# Altium schematic symbol library FPGA_Xilinx_Virtex7.SchLib: 34 symbols (part 20 of 34)
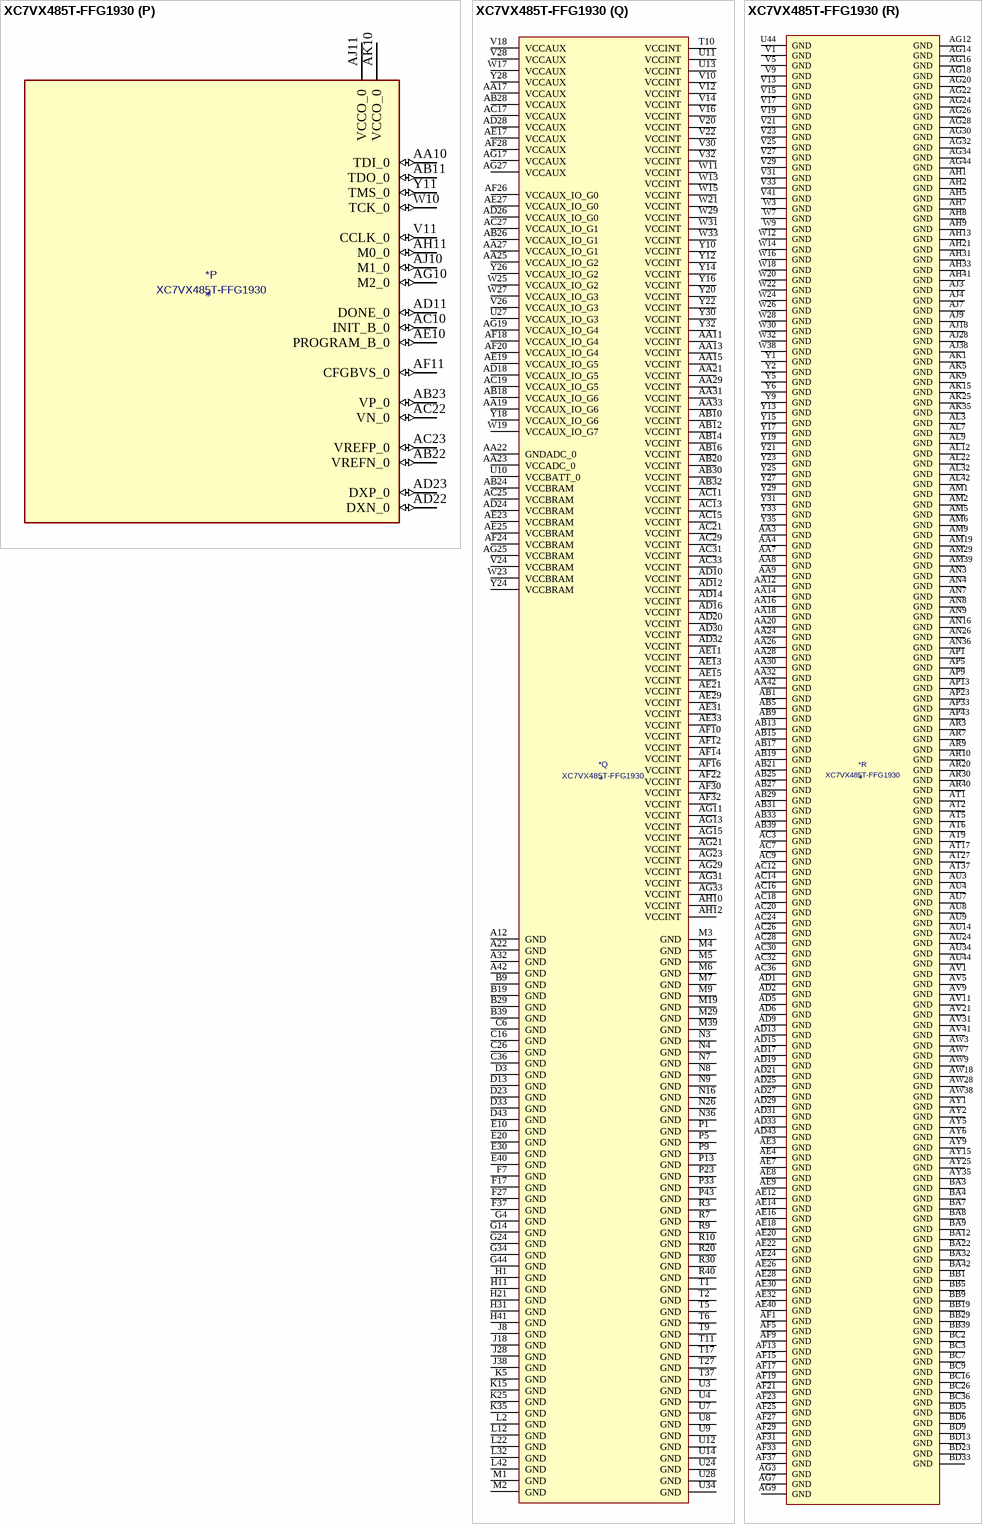
[diagram p191: symbol XC7VX485T-FFG1930]

## XC7VX485T-FFG1930
designator *  value XC7VX485T-FFG1930
ki_keywords: FPGA; ki_description: Virtex 7 XT 485 XC7VX485T-FFG1930
part A pins: AK30 VCCO_10 (power), AN31 VCCO_10 (power), AU29 VCCO_10 (power), AW33 VCCO_10 (power), AW43 VCCO_11 (power), AY30 VCCO_10 (power), AY40 VCCO_11 (power), BA37 VCCO_11 (power), BB34 VCCO_11 (power), BB44 VCCO_11 (power), BC31 VCCO_10 (power), BC41 VCCO_11 (power), BD38 VCCO_11 (power)
part B pins: AH26 VCCO_12 (power), AL27 VCCO_12 (power), AP28 VCCO_12 (power), AP32 IO_L24P_T3_13 (io), AP34 IO_L21P_T3_DQS_13 (io), AP35 IO_0_VRN_13 (io), AP36 IO_L15P_T2_DQS_13 (io), AP38 VCCO_13 (power), AR25 VCCO_12 (power), AR32 IO_L24N_T3_13 (io), AR33 IO_L23P_T3_13 (io), AR34 IO_L21N_T3_DQS_13 (io), AR35 VCCO_13 (power), AR36 IO_L17P_T2_13 (io), AR37 IO_L15N_T2_DQS_13 (io), AR38 IO_L12P_T1_MRCC_13 (io), AR39 IO_L7P_T1_13 (io), AR41 IO_L6P_T0_13 (io), AR42 IO_L5P_T0_13 (io), AR43 IO_L5N_T0_13 (io), AR44 IO_L1P_T0_13 (io), AT32 VCCO_13 (power), AT33 IO_L23N_T3_13 (io), AT34 IO_L19P_T3_13 (io), AT35 IO_L19N_T3_VREF_13 (io), AT36 IO_L17N_T2_13 (io), AT38 IO_L11P_T1_SRCC_13 (io), AT39 IO_L12N_T1_MRCC_13 (io), AT40 IO_L7N_T1_13 (io), AT41 IO_L6N_T0_VREF_13 (io), AT42 VCCO_13 (power), AT43 IO_L3P_T0_DQS_13 (io), AT44 IO_L1N_T0_13 (io), AU32 IO_L20P_T3_13 (io), AU33 IO_L20N_T3_13 (io), AU35 IO_25_VRP_13 (io), AU36 IO_L13P_T2_MRCC_13 (io), AU37 IO_L13N_T2_MRCC_13 (io), AU38 IO_L11N_T1_SRCC_13 (io), AU39 VCCO_13 (power), AU40 IO_L9P_T1_DQS_13 (io), AU41 IO_L9N_T1_DQS_13 (io), AU42 IO_L4P_T0_13 (io), AU43 IO_L3N_T0_DQS_13 (io), AV26 VCCO_12 (power), AV33 IO_L22P_T3_13 (io), AV34 IO_L22N_T3_13 (io), AV35 IO_L16P_T2_13 (io), AV36 VCCO_13 (power), AV37 IO_L14P_T2_SRCC_13 (io), AV38 IO_L14N_T2_SRCC_13 (io), AV39 IO_L10P_T1_13 (io), AV40 IO_L8P_T1_13 (io), AV42 IO_L4N_T0_13 (io), AV43 IO_L2P_T0_13 (io), AV44 IO_L2N_T0_13 (io), AW35 IO_L16N_T2_13 (io), AW36 IO_L18P_T2_13 (io), AW37 IO_L18N_T2_13 (io), AW39 IO_L10N_T1_13 (io), AW40 IO_L8N_T1_13 (io), BA27 VCCO_12 (power), BD28 VCCO_12 (power)
part C pins: AH22 IO_L2P_T0_D02_14 (io), AH23 IO_L2N_T0_D03_14 (io), AH24 IO_L1P_T0_D00_MOSI_14 (io), AH25 IO_L1N_T0_D01_DIN_14 (io), AH32 IO_L21P_T3_DQS_15 (io), AJ21 IO_0_VRN_14 (io), AJ22 IO_L6P_T0_FCS_B_14 (io), AJ23 VCCO_14 (power), AJ24 IO_L5P_T0_D06_14 (io), AJ32 IO_L21N_T3_DQS_A18_15 (io), AJ33 VCCO_15 (power), AJ34 IO_L19P_T3_A22_15 (io), AJ35 IO_0_VRN_15 (io), AJ36 IO_L13P_T2_MRCC_15 (io), AK21 IO_L4P_T0_D04_14 (io), AK22 IO_L6N_T0_D08_VREF_14 (io), AK23 IO_L3P_T0_DQS_PUDC_B_14 (io), AK24 IO_L5N_T0_D07_14 (io), AK32 IO_L20P_T3_A20_15 (io), AK33 IO_L20N_T3_A19_15 (io), AK34 IO_L19N_T3_A21_VREF_15 (io), AK36 IO_L16P_T2_A28_15 (io), AK37 IO_L13N_T2_MRCC_15 (io), AK38 IO_L11P_T1_SRCC_15 (io), AK39 IO_L9P_T1_DQS_AD3P_15 (io), AK40 VCCO_15 (power), AK41 IO_L6P_T0_15 (io), AL21 IO_L4N_T0_D05_14 (io), AL23 IO_L3N_T0_DQS_EMCCLK_14 (io), AL24 IO_25_VRP_14 (io), AL33 IO_L23P_T3_FOE_B_15 (io), AL34 IO_L23N_T3_FWE_B_15 (io), AL35 IO_L18P_T2_A24_15 (io), AL36 IO_L16N_T2_A27_15 (io), AL37 VCCO_15 (power), AL38 IO_L11N_T1_SRCC_15 (io), AL39 IO_L9N_T1_DQS_AD3N_15 (io), AL40 IO_L7P_T1_AD2P_15 (io), AL41 IO_L6N_T0_VREF_15 (io), AL43 IO_L1P_T0_AD0P_15 (io), AL44 IO_L1N_T0_AD0N_15 (io), AM21 IO_L8P_T1_D11_14 (io), AM22 IO_L8N_T1_D12_14 (io), AM23 IO_L7P_T1_D09_14 (io), AM24 VCCO_14 (power), AM32 IO_L22P_T3_A17_15 (io), AM33 IO_L22N_T3_A16_15 (io), AM34 VCCO_15 (power), AM35 IO_L17P_T2_A26_15 (io), AM36 IO_L18N_T2_A23_15 (io), AM37 IO_L14P_T2_SRCC_15 (io), AM38 IO_L14N_T2_SRCC_15 (io), AM40 IO_L7N_T1_AD2N_15 (io), AM41 IO_L2P_T0_AD8P_15 (io), AM42 IO_L2N_T0_AD8N_15 (io), AM43 IO_L5P_T0_AD9P_15 (io), AM44 VCCO_15 (power), AN21 VCCO_14 (power), AN22 IO_L10P_T1_D14_14 (io), AN23 IO_L7N_T1_D10_14 (io), AN24 IO_L9P_T1_DQS_14 (io), AN32 IO_25_VRP_15 (io), AN33 IO_L24P_T3_RS1_15 (io), AN34 IO_L24N_T3_RS0_15 (io), AN35 IO_L17N_T2_A25_15 (io), AN37 IO_L15P_T2_DQS_15 (io), AN38 IO_L12P_T1_MRCC_15 (io), AN39 IO_L12N_T1_MRCC_15 (io), AN40 IO_L8P_T1_AD10P_15 (io), AN41 VCCO_15 (power), AN42 IO_L4P_T0_15 (io), AN43 IO_L5N_T0_AD9N_15 (io), AN44 IO_L3P_T0_DQS_AD1P_15 (io), AP21 IO_L12P_T1_MRCC_14 (io), AP22 IO_L10N_T1_D15_14 (io), AP24 IO_L9N_T1_DQS_D13_14 (io), AP37 IO_L15N_T2_DQS_ADV_B_15 (io), AP39 IO_L10P_T1_AD11P_15 (io), AP40 IO_L10N_T1_AD11N_15 (io), AP41 IO_L8N_T1_AD10N_15 (io), AP42 IO_L4N_T0_15 (io), AP44 IO_L3N_T0_DQS_AD1N_15 (io), AR21 IO_L13P_T2_MRCC_14 (io), AR22 IO_L12N_T1_MRCC_14 (io), AR23 IO_L11P_T1_SRCC_14 (io), AR24 IO_L11N_T1_SRCC_14 (io), AT21 IO_L13N_T2_MRCC_14 (io), AT22 VCCO_14 (power), AT23 IO_L14P_T2_SRCC_14 (io), AT24 IO_L14N_T2_SRCC_14 (io), AU21 IO_L15P_T2_DQS_RDWR_B_14 (io), AU22 IO_L15N_T2_DQS_DOUT_CSO_B_14 (io), AU23 IO_L16P_T2_CSI_B_14 (io), AV22 IO_L17P_T2_A14_D30_14 (io), AV23 IO_L16N_T2_A15_D31_14 (io), AV24 IO_L18P_T2_A12_D28_14 (io), AW22 IO_L17N_T2_A13_D29_14 (io), AW23 VCCO_14 (power), AW24 IO_L18N_T2_A11_D27_14 (io), AY22 IO_L19P_T3_A10_D26_14 (io), AY23 IO_L19N_T3_A09_D25_VREF_14 (io), AY24 IO_L20P_T3_A08_D24_14 (io), BA23 IO_L22P_T3_A05_D21_14 (io), BA24 IO_L20N_T3_A07_D23_14 (io), BB22 IO_L23P_T3_A03_D19_14 (io), BB23 IO_L22N_T3_A04_D20_14 (io), BB24 VCCO_14 (power), BC22 IO_L21P_T3_DQS_14 (io), BC23 IO_L23N_T3_A02_D18_14 (io), BC24 IO_L24P_T3_A01_D17_14 (io), BD22 IO_L21N_T3_DQS_A06_D22_14 (io), BD24 IO_L24N_T3_A00_D16_14 (io)
part D pins: AA34 IO_L22P_T3_17 (io), AA35 IO_L21N_T3_DQS_17 (io), AA36 IO_L19P_T3_17 (io), AA37 VCCO_17 (power), AA38 IO_L15N_T2_DQS_17 (io), AA39 IO_L14P_T2_SRCC_17 (io), AA40 IO_L14N_T2_SRCC_17 (io), AA41 IO_L9N_T1_DQS_17 (io), AA43 IO_L1P_T0_17 (io), AA44 IO_L1N_T0_17 (io), AB34 VCCO_17 (power), AB35 IO_L21P_T3_DQS_17 (io), AB36 IO_L23P_T3_17 (io), AB37 IO_L23N_T3_17 (io), AB38 IO_L15P_T2_DQS_17 (io), AB40 IO_L12N_T1_MRCC_17 (io), AB41 IO_L9P_T1_DQS_17 (io), AB42 IO_L8N_T1_17 (io), AB43 IO_L5N_T0_17 (io), AB44 VCCO_17 (power), AC34 IO_L24P_T3_17 (io), AC35 IO_L24N_T3_17 (io), AC37 IO_25_VRP_17 (io), AC38 IO_L17P_T2_17 (io), AC39 IO_L17N_T2_17 (io), AC40 IO_L12P_T1_MRCC_17 (io), AC41 VCCO_17 (power), AC42 IO_L8P_T1_17 (io), AC43 IO_L5P_T0_17 (io), AC44 IO_L3N_T0_DQS_17 (io), AD34 IO_L20P_T3_16 (io), AD35 IO_L20N_T3_16 (io), AD36 IO_L19P_T3_16 (io), AD37 IO_0_VRN_16 (io), AD38 VCCO_16 (power), AD39 IO_L7P_T1_16 (io), AD40 IO_L7N_T1_16 (io), AD41 IO_L10P_T1_17 (io), AD42 IO_L10N_T1_17 (io), AD44 IO_L3P_T0_DQS_17 (io), AE34 IO_L21P_T3_DQS_16 (io), AE35 VCCO_16 (power), AE36 IO_L22P_T3_16 (io), AE37 IO_L19N_T3_VREF_16 (io), AE38 IO_L16P_T2_16 (io), AE39 IO_L16N_T2_16 (io), AE41 IO_L9P_T1_DQS_16 (io), AE42 IO_L9N_T1_DQS_16 (io), AE43 IO_L5P_T0_16 (io), AE44 IO_L3P_T0_DQS_16 (io), AF34 IO_L21N_T3_DQS_16 (io), AF35 IO_L23P_T3_16 (io), AF36 IO_L22N_T3_16 (io), AF38 IO_L18P_T2_16 (io), AF39 IO_L13P_T2_MRCC_16 (io), AF40 IO_L13N_T2_MRCC_16 (io), AF41 IO_L8P_T1_16 (io), AF42 VCCO_16 (power), AF43 IO_L5N_T0_16 (io), AF44 IO_L3N_T0_DQS_16 (io), AG35 IO_L24P_T3_16 (io), AG36 IO_L23N_T3_16 (io), AG37 IO_L15P_T2_DQS_16 (io), AG38 IO_L18N_T2_16 (io), AG39 VCCO_16 (power), AG40 IO_L11P_T1_SRCC_16 (io), AG41 IO_L8N_T1_16 (io), AG42 IO_L10P_T1_16 (io), AG43 IO_L2P_T0_16 (io), AH34 IO_25_VRP_16 (io), AH35 IO_L24N_T3_16 (io), AH36 VCCO_16 (power), AH37 IO_L17P_T2_16 (io), AH38 IO_L15N_T2_DQS_16 (io), AH39 IO_L14P_T2_SRCC_16 (io), AH40 IO_L11N_T1_SRCC_16 (io), AH42 IO_L10N_T1_16 (io), AH43 IO_L2N_T0_16 (io), AH44 IO_L1P_T0_16 (io), AJ37 IO_L17N_T2_16 (io), AJ39 IO_L14N_T2_SRCC_16 (io), AJ40 IO_L12P_T1_MRCC_16 (io), AJ41 IO_L12N_T1_MRCC_16 (io), AJ42 IO_L6P_T0_16 (io), AJ43 VCCO_16 (power), AJ44 IO_L1N_T0_16 (io), AK42 IO_L6N_T0_VREF_16 (io), AK43 IO_L4P_T0_16 (io), AK44 IO_L4N_T0_16 (io), V42 IO_L7N_T1_17 (io), V43 IO_L2P_T0_17 (io), V44 IO_L2N_T0_17 (io), W34 IO_L20P_T3_17 (io), W35 IO_L20N_T3_17 (io), W36 IO_0_VRN_17 (io), W37 IO_L16N_T2_17 (io), W39 IO_L18N_T2_17 (io), W40 IO_L13N_T2_MRCC_17 (io), W41 IO_L11N_T1_SRCC_17 (io), W42 IO_L7P_T1_17 (io), W43 VCCO_17 (power), W44 IO_L4N_T0_17 (io), Y34 IO_L22N_T3_17 (io), Y36 IO_L19N_T3_VREF_17 (io), Y37 IO_L16P_T2_17 (io), Y38 IO_L18P_T2_17 (io), Y39 IO_L13P_T2_MRCC_17 (io), Y40 VCCO_17 (power), Y41 IO_L11P_T1_SRCC_17 (io), Y42 IO_L6P_T0_17 (io), Y43 IO_L6N_T0_VREF_17 (io), Y44 IO_L4P_T0_17 (io)
part E pins: K33 IO_L4N_T0_19 (io), K34 IO_L8N_T1_19 (io), K36 IO_L12N_T1_MRCC_19 (io), K37 IO_L13P_T2_MRCC_19 (io), K38 IO_L13N_T2_MRCC_19 (io), K39 IO_L16N_T2_19 (io), K40 VCCO_19 (power), K41 IO_L19N_T3_VREF_19 (io), K42 IO_L21P_T3_DQS_19 (io), K43 IO_L21N_T3_DQS_19 (io), K44 IO_L24N_T3_19 (io), L30 IO_0_VRN_19 (io), L31 IO_L2N_T0_19 (io), L33 IO_L4P_T0_19 (io), L34 IO_L8P_T1_19 (io), L35 IO_L10N_T1_19 (io), L36 IO_L12P_T1_MRCC_19 (io), L37 VCCO_19 (power), L38 IO_L14N_T2_SRCC_19 (io), L39 IO_L16P_T2_19 (io), L40 IO_L18N_T2_19 (io), L41 IO_L19P_T3_19 (io), L43 IO_L23N_T3_19 (io), L44 IO_L24P_T3_19 (io), M30 IO_L2P_T0_19 (io), M31 IO_L1P_T0_19 (io), M32 IO_L1N_T0_19 (io), M33 IO_L6N_T0_VREF_19 (io), M34 VCCO_19 (power), M35 IO_L10P_T1_19 (io), M36 IO_L9N_T1_DQS_19 (io), M37 IO_L11N_T1_SRCC_19 (io), M38 IO_L14P_T2_SRCC_19 (io), M40 IO_L18P_T2_19 (io), M41 IO_L17N_T2_19 (io), M42 IO_L20N_T3_19 (io), M43 IO_L23P_T3_19 (io), M44 VCCO_19 (power), N30 IO_L3N_T0_DQS_19 (io), N31 VCCO_19 (power), N32 IO_L6P_T0_19 (io), N33 IO_25_VRP_19 (io), N34 IO_L7N_T1_19 (io), N35 IO_L9P_T1_DQS_19 (io), N37 IO_L11P_T1_SRCC_19 (io), N38 IO_L15P_T2_DQS_19 (io), N39 IO_L15N_T2_DQS_19 (io), N40 IO_L17P_T2_19 (io), N41 VCCO_19 (power), N42 IO_L20P_T3_19 (io), N43 IO_L22P_T3_19 (io), N44 IO_L22N_T3_19 (io), P30 IO_L3P_T0_DQS_19 (io), P31 IO_L5P_T0_19 (io), P32 IO_L5N_T0_19 (io), P34 IO_L7P_T1_19 (io), P35 IO_0_VRN_18 (io), P36 IO_L8N_T1_18 (io), P37 IO_L12N_T1_MRCC_18 (io), P38 VCCO_18 (power), P39 IO_L15P_T2_DQS_18 (io), P40 IO_L15N_T2_DQS_18 (io), P41 IO_L21P_T3_DQS_18 (io), P42 IO_L21N_T3_DQS_18 (io), P44 IO_L24N_T3_18 (io), R31 IO_L2P_T0_18 (io), R32 IO_L2N_T0_18 (io), R33 IO_L4P_T0_18 (io), R34 IO_L4N_T0_18 (io), R35 VCCO_18 (power), R36 IO_L8P_T1_18 (io), R37 IO_L12P_T1_MRCC_18 (io), R38 IO_L14P_T2_SRCC_18 (io), R39 IO_L14N_T2_SRCC_18 (io), R41 IO_L19N_T3_VREF_18 (io), R42 IO_L23P_T3_18 (io), R43 IO_L23N_T3_18 (io), R44 IO_L24P_T3_18 (io), T30 IO_L1P_T0_18 (io), T31 IO_L1N_T0_18 (io), T32 VCCO_18 (power), T33 IO_L6P_T0_18 (io), T34 IO_L6N_T0_VREF_18 (io), T35 IO_L10P_T1_18 (io), T36 IO_L10N_T1_18 (io), T38 IO_L13N_T2_MRCC_18 (io), T39 IO_L17P_T2_18 (io), T40 IO_L17N_T2_18 (io), T41 IO_L19P_T3_18 (io), T42 VCCO_18 (power), T43 IO_L22P_T3_18 (io), T44 IO_L22N_T3_18 (io), U30 IO_L3P_T0_DQS_18 (io), U31 IO_L3N_T0_DQS_18 (io), U32 IO_L5P_T0_18 (io), U33 IO_L5N_T0_18 (io), U35 IO_L9N_T1_DQS_18 (io), U36 IO_L7P_T1_18 (io), U37 IO_L7N_T1_18 (io), U38 IO_L13P_T2_MRCC_18 (io), U39 VCCO_18 (power), U40 IO_L18P_T2_18 (io), U41 IO_L18N_T2_18 (io), U42 IO_L20P_T3_18 (io), U43 IO_L20N_T3_18 (io), V34 IO_25_VRP_18 (io), V35 IO_L9P_T1_DQS_18 (io), V36 VCCO_18 (power), V37 IO_L11P_T1_SRCC_18 (io), V38 IO_L11N_T1_SRCC_18 (io), V39 IO_L16P_T2_18 (io), V40 IO_L16N_T2_18 (io)
part F pins: A37 VCCO_21 (power), B34 VCCO_21 (power), C31 VCCO_21 (power), C41 VCCO_21 (power), D38 VCCO_21 (power), E35 VCCO_20 (power), F32 VCCO_20 (power), F42 VCCO_21 (power), G39 VCCO_20 (power), H36 VCCO_20 (power), J33 VCCO_20 (power), J43 VCCO_20 (power)
part G pins: AH16 VCCO_31 (power), AK20 VCCO_30 (power), AL17 VCCO_30 (power), AM14 VCCO_31 (power), AP18 VCCO_30 (power), AR15 VCCO_31 (power), AU19 VCCO_30 (power), AV16 VCCO_31 (power), AY20 VCCO_30 (power), BA17 VCCO_31 (power), BB14 VCCO_31 (power), BC21 VCCO_30 (power), BD18 VCCO_30 (power)
part H pins: A27 VCCO_33 (power), A28 IO_L20P_T3_33 (io), A29 IO_L20N_T3_33 (io), A30 IO_L24N_T3_33 (io), AJ13 VCCO_32 (power), AN11 VCCO_32 (power), AT12 VCCO_32 (power), AW13 VCCO_32 (power), AY10 VCCO_32 (power), B27 IO_L23P_T3_33 (io), B28 IO_L23N_T3_33 (io), B30 IO_L24P_T3_33 (io), BC11 VCCO_32 (power), C27 IO_L21P_T3_DQS_33 (io), C28 IO_L21N_T3_DQS_33 (io), C29 IO_L22P_T3_33 (io), C30 IO_L22N_T3_33 (io), D27 IO_L15N_T2_DQS_33 (io), D28 VCCO_33 (power), D29 IO_L19P_T3_33 (io), D30 IO_L19N_T3_VREF_33 (io), E27 IO_L15P_T2_DQS_33 (io), E28 IO_L17N_T2_33 (io), E29 IO_L16N_T2_33 (io), F28 IO_L17P_T2_33 (io), F29 IO_L16P_T2_33 (io), F30 IO_L18N_T2_33 (io), G27 IO_L14P_T2_SRCC_33 (io), G28 IO_L14N_T2_SRCC_33 (io), G29 VCCO_33 (power), G30 IO_L18P_T2_33 (io), H27 IO_L13P_T2_MRCC_33 (io), H28 IO_L13N_T2_MRCC_33 (io), H29 IO_L12P_T1_MRCC_33 (io), H30 IO_L12N_T1_MRCC_33 (io), J27 IO_L10N_T1_33 (io), J29 IO_L11P_T1_SRCC_33 (io), J30 IO_L11N_T1_SRCC_33 (io), K27 IO_L10P_T1_33 (io), K28 IO_L8N_T1_33 (io), K29 IO_L9N_T1_DQS_33 (io), K30 VCCO_33 (power), L27 VCCO_33 (power), L28 IO_L8P_T1_33 (io), L29 IO_L9P_T1_DQS_33 (io), M27 IO_L7P_T1_33 (io), M28 IO_L7N_T1_33 (io), N27 IO_L5P_T0_33 (io), N28 IO_L5N_T0_33 (io), N29 IO_25_VRP_33 (io), P26 IO_L4P_T0_33 (io), P27 IO_L4N_T0_33 (io), P28 VCCO_33 (power), P29 IO_L3N_T0_DQS_33 (io), R26 IO_L2N_T0_33 (io), R27 IO_L6P_T0_33 (io), R28 IO_L6N_T0_VREF_33 (io), R29 IO_L3P_T0_DQS_33 (io), T26 IO_L2P_T0_33 (io), T28 IO_L1P_T0_33 (io), T29 IO_L1N_T0_33 (io), U26 IO_0_VRN_33 (io), U29 VCCO_33 (power)
part I pins: A20 IO_L24N_T3_35 (io), A21 IO_L24P_T3_35 (io), A23 IO_L23N_T3_35 (io), A24 IO_L21P_T3_DQS_34 (io), A25 IO_L21N_T3_DQS_34 (io), A26 IO_L23N_T3_34 (io), B20 IO_L20N_T3_35 (io), B21 IO_L22N_T3_35 (io), B22 IO_L21N_T3_DQS_35 (io), B23 IO_L23P_T3_35 (io), B24 VCCO_34 (power), B25 IO_L24N_T3_34 (io), B26 IO_L23P_T3_34 (io), C20 IO_L20P_T3_35 (io), C21 VCCO_35 (power), C22 IO_L22P_T3_35 (io), C23 IO_L21P_T3_DQS_35 (io), C24 IO_L24P_T3_34 (io), C25 IO_L22N_T3_34 (io), D20 IO_L19N_T3_VREF_35 (io), D21 IO_L19P_T3_35 (io), D22 IO_L18N_T2_35 (io), D24 IO_L20N_T3_34 (io), D25 IO_L22P_T3_34 (io), D26 IO_L19N_T3_VREF_34 (io), E21 IO_L16N_T2_35 (io), E22 IO_L16P_T2_35 (io), E23 IO_L18P_T2_35 (io), E24 IO_L20P_T3_34 (io), E25 VCCO_34 (power), E26 IO_L19P_T3_34 (io), F20 IO_L15N_T2_DQS_35 (io), F21 IO_L17N_T2_35 (io), F22 VCCO_35 (power), F23 IO_L17N_T2_34 (io), F24 IO_L16P_T2_34 (io), F25 IO_L16N_T2_34 (io), F26 IO_L18N_T2_34 (io), G20 IO_L15P_T2_DQS_35 (io), G21 IO_L17P_T2_35 (io), G22 IO_L14N_T2_SRCC_35 (io), G23 IO_L17P_T2_34 (io), G25 IO_L15N_T2_DQS_34 (io), G26 IO_L18P_T2_34 (io), H20 IO_L13N_T2_MRCC_35 (io), H22 IO_L14P_T2_SRCC_35 (io), H23 IO_L13P_T2_MRCC_34 (io), H24 IO_L13N_T2_MRCC_34 (io), H25 IO_L15P_T2_DQS_34 (io), H26 VCCO_34 (power), J20 IO_L13P_T2_MRCC_35 (io), J21 IO_L12N_T1_MRCC_35 (io), J22 IO_L11N_T1_SRCC_35 (io), J23 VCCO_34 (power), J24 IO_L12N_T1_MRCC_34 (io), J25 IO_L14P_T2_SRCC_34 (io), J26 IO_L14N_T2_SRCC_34 (io), K20 VCCO_35 (power), K21 IO_L12P_T1_MRCC_35 (io), K22 IO_L11P_T1_SRCC_35 (io), K23 IO_L10N_T1_34 (io), K24 IO_L12P_T1_MRCC_34 (io), K26 IO_L11N_T1_SRCC_34 (io), L19 IO_L9N_T1_DQS_AD7N_35 (io), L20 IO_L9P_T1_DQS_AD7P_35 (io), L21 IO_L10N_T1_AD15N_35 (io), L23 IO_L10P_T1_34 (io), L24 IO_L7P_T1_34 (io), L25 IO_L7N_T1_34 (io), L26 IO_L11P_T1_SRCC_34 (io), M20 IO_L8N_T1_AD14N_35 (io), M21 IO_L10P_T1_AD15P_35 (io), M22 IO_L7N_T1_AD6N_35 (io), M23 IO_L8N_T1_34 (io), M24 VCCO_34 (power), M25 IO_L9P_T1_DQS_34 (io), M26 IO_L9N_T1_DQS_34 (io), N19 IO_L6N_T0_VREF_35 (io), N20 IO_L8P_T1_AD14P_35 (io), N21 VCCO_35 (power), N22 IO_L7P_T1_AD6P_35 (io), N23 IO_L8P_T1_34 (io), N24 IO_L1N_T0_34 (io), N25 IO_25_VRP_34 (io), P18 VCCO_35 (power), P19 IO_L4N_T0_35 (io), P20 IO_L6P_T0_35 (io), P21 IO_25_VRP_35 (io), P22 IO_L4N_T0_34 (io), P24 IO_L1P_T0_34 (io), P25 IO_L3N_T0_DQS_34 (io), R18 IO_L2N_T0_AD12N_35 (io), R19 IO_L4P_T0_35 (io), R21 IO_L5N_T0_AD13N_35 (io), R22 IO_L4P_T0_34 (io), R23 IO_L2N_T0_34 (io), R24 IO_L3P_T0_DQS_34 (io), R25 VCCO_34 (power), T18 IO_L2P_T0_AD12P_35 (io), T19 IO_L1N_T0_AD4N_35 (io), T20 IO_L1P_T0_AD4P_35 (io), T21 IO_L5P_T0_AD13P_35 (io), T22 VCCO_34 (power), T23 IO_L2P_T0_34 (io), T24 IO_L6N_T0_VREF_34 (io), T25 IO_L5N_T0_34 (io), U18 IO_0_VRN_35 (io), U19 VCCO_35 (power), U20 IO_L3N_T0_DQS_AD5N_35 (io), U21 IO_L3P_T0_DQS_AD5P_35 (io), U22 IO_0_VRN_34 (io), U23 IO_L6P_T0_34 (io), U25 IO_L5P_T0_34 (io)
part J pins: A3 IO_L1N_T0_36 (io), A4 IO_L1P_T0_36 (io), A5 IO_L4N_T0_36 (io), A6 IO_L2N_T0_36 (io), A7 VCCO_37 (power), A8 IO_L2N_T0_37 (io), A9 IO_L2P_T0_37 (io), A10 IO_L3N_T0_DQS_37 (io), A11 IO_L1N_T0_37 (io), B2 IO_L5N_T0_36 (io), B3 IO_L3N_T0_DQS_36 (io), B4 VCCO_36 (power), B5 IO_L4P_T0_36 (io), B6 IO_L2P_T0_36 (io), B7 IO_L4N_T0_37 (io), B8 IO_L4P_T0_37 (io), B10 IO_L3P_T0_DQS_37 (io), B11 IO_L1P_T0_37 (io), C1 VCCO_36 (power), C2 IO_L5P_T0_36 (io), C3 IO_L3P_T0_DQS_36 (io), C4 IO_L6N_T0_VREF_36 (io), C5 IO_L6P_T0_36 (io), C7 IO_L6N_T0_VREF_37 (io), C8 IO_L6P_T0_37 (io), C9 IO_L5N_T0_37 (io), C10 IO_L5P_T0_37 (io), C11 VCCO_37 (power), D1 IO_L7N_T1_36 (io), D2 IO_L7P_T1_36 (io), D4 IO_L10N_T1_36 (io), D5 IO_L8N_T1_36 (io), D6 IO_L10N_T1_37 (io), D7 IO_L10P_T1_37 (io), D8 VCCO_37 (power), D9 IO_L9N_T1_DQS_37 (io), D10 IO_L9P_T1_DQS_37 (io), D11 IO_L7N_T1_37 (io), E1 IO_L9N_T1_DQS_36 (io), E2 IO_L12N_T1_MRCC_36 (io), E3 IO_L12P_T1_MRCC_36 (io), E4 IO_L10P_T1_36 (io), E5 VCCO_36 (power), E6 IO_L8P_T1_36 (io), E7 IO_L12N_T1_MRCC_37 (io), E8 IO_L8N_T1_37 (io), E9 IO_L8P_T1_37 (io), E11 IO_L7P_T1_37 (io), F1 IO_L9P_T1_DQS_36 (io), F2 VCCO_36 (power), F3 IO_L11N_T1_SRCC_36 (io), F4 IO_L11P_T1_SRCC_36 (io), F5 IO_L13N_T2_MRCC_36 (io), F6 IO_L13P_T2_MRCC_36 (io), F8 IO_L12P_T1_MRCC_37 (io), F9 IO_L11N_T1_SRCC_37 (io), F10 IO_L11P_T1_SRCC_37 (io), F11 IO_L13N_T2_MRCC_37 (io), G1 IO_L18N_T2_36 (io), G2 IO_L14N_T2_SRCC_36 (io), G3 IO_L14P_T2_SRCC_36 (io), G5 IO_L15N_T2_DQS_36 (io), G6 IO_L15P_T2_DQS_36 (io), G7 IO_L14N_T2_SRCC_37 (io), G8 IO_L14P_T2_SRCC_37 (io), G9 VCCO_37 (power), G10 IO_L16N_T2_37 (io), G11 IO_L13P_T2_MRCC_37 (io), H2 IO_L18P_T2_36 (io), H3 IO_L16N_T2_36 (io), H4 IO_L16P_T2_36 (io), H5 IO_L17N_T2_36 (io), H6 VCCO_36 (power), H7 IO_L17N_T2_37 (io), H8 IO_L17P_T2_37 (io), H9 IO_L15N_T2_DQS_37 (io), H10 IO_L16P_T2_37 (io), J1 IO_L20N_T3_36 (io), J2 IO_L20P_T3_36 (io), J3 VCCO_36 (power), J4 IO_L19N_T3_VREF_36 (io), J5 IO_L19P_T3_36 (io), J6 IO_L17P_T2_36 (io), J7 IO_L20N_T3_37 (io), J9 IO_L15P_T2_DQS_37 (io), J10 IO_L18N_T2_37 (io), J11 IO_L18P_T2_37 (io), K1 IO_L22N_T3_36 (io), K2 IO_L23N_T3_36 (io), K3 IO_L21N_T3_DQS_36 (io), K4 IO_L21P_T3_DQS_36 (io), K6 IO_0_VRN_36 (io), K7 IO_L20P_T3_37 (io), K8 IO_L19N_T3_VREF_37 (io), K9 IO_L19P_T3_37 (io), K10 VCCO_37 (power), K11 IO_0_VRN_37 (io), L1 IO_L22P_T3_36 (io), L3 IO_L23P_T3_36 (io), L4 IO_25_VRP_36 (io), L5 IO_L24N_T3_36 (io), L6 IO_L24P_T3_36 (io), L7 VCCO_37 (power), L8 IO_L22N_T3_37 (io), L9 IO_L22P_T3_37 (io), L10 IO_L21N_T3_DQS_37 (io), L11 IO_L21P_T3_DQS_37 (io), M8 IO_25_VRP_37 (io), M10 IO_L23N_T3_37 (io), M11 IO_L23P_T3_37 (io), N10 IO_L24N_T3_37 (io), N11 VCCO_37 (power), P10 IO_L24P_T3_37 (io)
part K pins: A13 IO_L3N_T0_DQS_38 (io), A14 IO_L3P_T0_DQS_38 (io), A15 IO_L24N_T3_39 (io), A16 IO_L24P_T3_39 (io), A17 VCCO_39 (power), A18 IO_L23N_T3_39 (io), A19 IO_L23P_T3_39 (io), B12 IO_L2N_T0_38 (io), B13 IO_L5N_T0_38 (io), B14 VCCO_38 (power), B15 IO_L20N_T3_39 (io), B16 IO_L22N_T3_39 (io), B17 IO_L21N_T3_DQS_39 (io), B18 IO_L21P_T3_DQS_39 (io), C12 IO_L2P_T0_38 (io), C13 IO_L5P_T0_38 (io), C14 IO_L1N_T0_38 (io), C15 IO_L20P_T3_39 (io), C17 IO_L22P_T3_39 (io), C18 IO_L19N_T3_VREF_39 (io), C19 IO_L19P_T3_39 (io), D12 IO_L4N_T0_38 (io), D14 IO_L1P_T0_38 (io), D15 IO_L18N_T2_39 (io), D16 IO_L18P_T2_39 (io), D17 IO_L16N_T2_39 (io), D18 VCCO_39 (power), D19 IO_L17N_T2_39 (io), E12 IO_L4P_T0_38 (io), E13 IO_L6N_T0_VREF_38 (io), E14 IO_L6P_T0_38 (io), E15 VCCO_38 (power), E16 IO_L13N_T2_MRCC_39 (io), E17 IO_L16P_T2_39 (io), E18 IO_L15N_T2_DQS_39 (io), E19 IO_L17P_T2_39 (io), F12 VCCO_38 (power), F13 IO_L9N_T1_DQS_38 (io), F14 IO_L9P_T1_DQS_38 (io), F15 IO_L7N_T1_38 (io), F16 IO_L13P_T2_MRCC_39 (io), F18 IO_L14N_T2_SRCC_39 (io), F19 IO_L15P_T2_DQS_39 (io), G12 IO_L8N_T1_38 (io), G13 IO_L8P_T1_38 (io), G15 IO_L7P_T1_38 (io), G16 IO_L12N_T1_MRCC_39 (io), G17 IO_L12P_T1_MRCC_39 (io), G18 IO_L14P_T2_SRCC_39 (io), G19 VCCO_39 (power), H12 IO_L11N_T1_SRCC_38 (io), H13 IO_L11P_T1_SRCC_38 (io), H14 IO_L10N_T1_38 (io), H15 IO_L10P_T1_38 (io), H16 VCCO_39 (power), H17 IO_L11N_T1_SRCC_39 (io), H18 IO_L11P_T1_SRCC_39 (io), H19 IO_L10N_T1_39 (io), J12 IO_L14N_T2_SRCC_38 (io), J13 VCCO_38 (power), J14 IO_L12N_T1_MRCC_38 (io), J15 IO_L12P_T1_MRCC_38 (io), J16 IO_L7N_T1_39 (io), J17 IO_L7P_T1_39 (io), J19 IO_L10P_T1_39 (io), K12 IO_L14P_T2_SRCC_38 (io), K13 IO_L13N_T2_MRCC_38 (io), K14 IO_L13P_T2_MRCC_38 (io), K16 IO_L8N_T1_39 (io), K17 IO_L8P_T1_39 (io), K18 IO_L9N_T1_DQS_39 (io), K19 IO_L9P_T1_DQS_39 (io), L13 IO_L16N_T2_38 (io), L14 IO_L16P_T2_38 (io), L15 IO_L15N_T2_DQS_38 (io), L16 IO_L2N_T0_39 (io), L17 VCCO_39 (power), L18 IO_0_VRN_39 (io), M12 IO_L18N_T2_38 (io), M13 IO_L18P_T2_38 (io), M14 VCCO_38 (power), M15 IO_L15P_T2_DQS_38 (io), M16 IO_L2P_T0_39 (io), M17 IO_L1N_T0_39 (io), M18 IO_L1P_T0_39 (io), N12 IO_L19N_T3_VREF_38 (io), N13 IO_L19P_T3_38 (io), N14 IO_L17N_T2_38 (io), N15 IO_L17P_T2_38 (io), N17 IO_L3N_T0_DQS_39 (io), N18 IO_L3P_T0_DQS_39 (io), P11 IO_L20N_T3_38 (io), P12 IO_L20P_T3_38 (io), P14 IO_L21N_T3_DQS_38 (io), P15 IO_0_VRN_38 (io), P16 IO_L5N_T0_39 (io), P17 IO_L6N_T0_VREF_39 (io), R11 IO_25_VRP_38 (io), R12 IO_L22N_T3_38 (io), R13 IO_L22P_T3_38 (io), R14 IO_L21P_T3_DQS_38 (io), R15 VCCO_39 (power), R16 IO_L5P_T0_39 (io), R17 IO_L6P_T0_39 (io), T12 VCCO_38 (power), T13 IO_L23N_T3_38 (io), T14 IO_L23P_T3_38 (io), T15 IO_L24N_T3_38 (io), T16 IO_L4N_T0_39 (io), U15 IO_L24P_T3_38 (io), U16 IO_L4P_T0_39 (io), U17 IO_25_VRP_39 (io)
part L pins: AP3 MGTXTXN3_114 (io), AP4 MGTXTXP3_114 (io), AR1 MGTXTXN2_114 (io), AR2 MGTXTXP2_114 (io), AR5 MGTXRXN3_114 (io), AR6 MGTXRXP3_114 (io), AT3 MGTXRXN2_114 (io), AT4 MGTXRXP2_114 (io), AT7 MGTREFCLK0N_114 (io), AT8 MGTREFCLK0P_114 (io), AU1 MGTXTXN1_114 (io), AU2 MGTXTXP1_114 (io), AU5 MGTXRXN1_114 (io), AU6 MGTXRXP1_114 (io), AV3 MGTXTXN0_114 (io), AV4 MGTXTXP0_114 (io), AV7 MGTREFCLK1N_114 (io), AV8 MGTREFCLK1P_114 (io), AW1 MGTXTXN3_113 (io), AW2 MGTXTXP3_113 (io), AW5 MGTXRXN0_114 (io), AW6 MGTXRXP0_114 (io), AY3 MGTXRXN3_113 (io), AY4 MGTXRXP3_113 (io), AY7 MGTREFCLK0N_113 (io), AY8 MGTREFCLK0P_113 (io), BA1 MGTXTXN2_113 (io), BA2 MGTXTXP2_113 (io), BA5 MGTXRXN2_113 (io), BA6 MGTXRXP2_113 (io), BB3 MGTXTXN1_113 (io), BB4 MGTXTXP1_113 (io), BB7 MGTREFCLK1N_113 (io), BB8 MGTREFCLK1P_113 (io), BC5 MGTXRXN1_113 (io), BC6 MGTXRXP1_113 (io), BD3 MGTXTXN0_113 (io), BD4 MGTXTXP0_113 (io), BD7 MGTXRXN0_113 (io), BD8 MGTXRXP0_113 (io)
part M pins: AC1 MGTXTXN3_116 (io), AC2 MGTXTXP3_116 (io), AC5 MGTXRXN3_116 (io), AC6 MGTXRXP3_116 (io), AD7 MGTREFCLK0N_116 (io), AD8 MGTREFCLK0P_116 (io), AE1 MGTXTXN2_116 (io), AE2 MGTXTXP2_116 (io), AE5 MGTXRXN2_116 (io), AE6 MGTXRXP2_116 (io), AF3 MGTXTXN1_116 (io), AF4 MGTXTXP1_116 (io), AF7 MGTREFCLK1N_116 (io), AF8 MGTREFCLK1P_116 (io), AG1 MGTXTXN0_116 (io), AG2 MGTXTXP0_116 (io), AG5 MGTXRXN0_116 (io), AG6 MGTXRXP0_116 (io), AH3 MGTXRXN1_116 (io), AH4 MGTXRXP1_116 (io), AJ1 MGTXTXN3_115 (io), AJ2 MGTXTXP3_115 (io), AJ5 MGTXRXN3_115 (io), AJ6 MGTXRXP3_115 (io), AK3 MGTXTXN2_115 (io), AK4 MGTXTXP2_115 (io), AL1 MGTXTXN1_115 (io), AL2 MGTXTXP1_115 (io), AL5 MGTXRXN1_115 (io), AL6 MGTXRXP1_115 (io), AM3 MGTXRXN2_115 (io), AM4 MGTXRXP2_115 (io), AM7 MGTREFCLK0N_115 (io), AM8 MGTREFCLK0P_115 (io), AN1 MGTXTXN0_115 (io), AN2 MGTXTXP0_115 (io), AN5 MGTXRXN0_115 (io), AN6 MGTXRXP0_115 (io), AP7 MGTREFCLK1N_115 (io), AP8 MGTREFCLK1P_115 (io)